# Altium footprint library Standard.PcbLib: 158 footprints (part 6 of 10)
Each footprint in its own frame and in the unit in brackets; x right, y up, seen from the top. Pads: shape width x height; smd on the part's side, far side on the other; paste and mask are expansions set on the pad; w line width, h text height; cw(c..) or ccw(c..) is an arc to the next point about the centre after c.
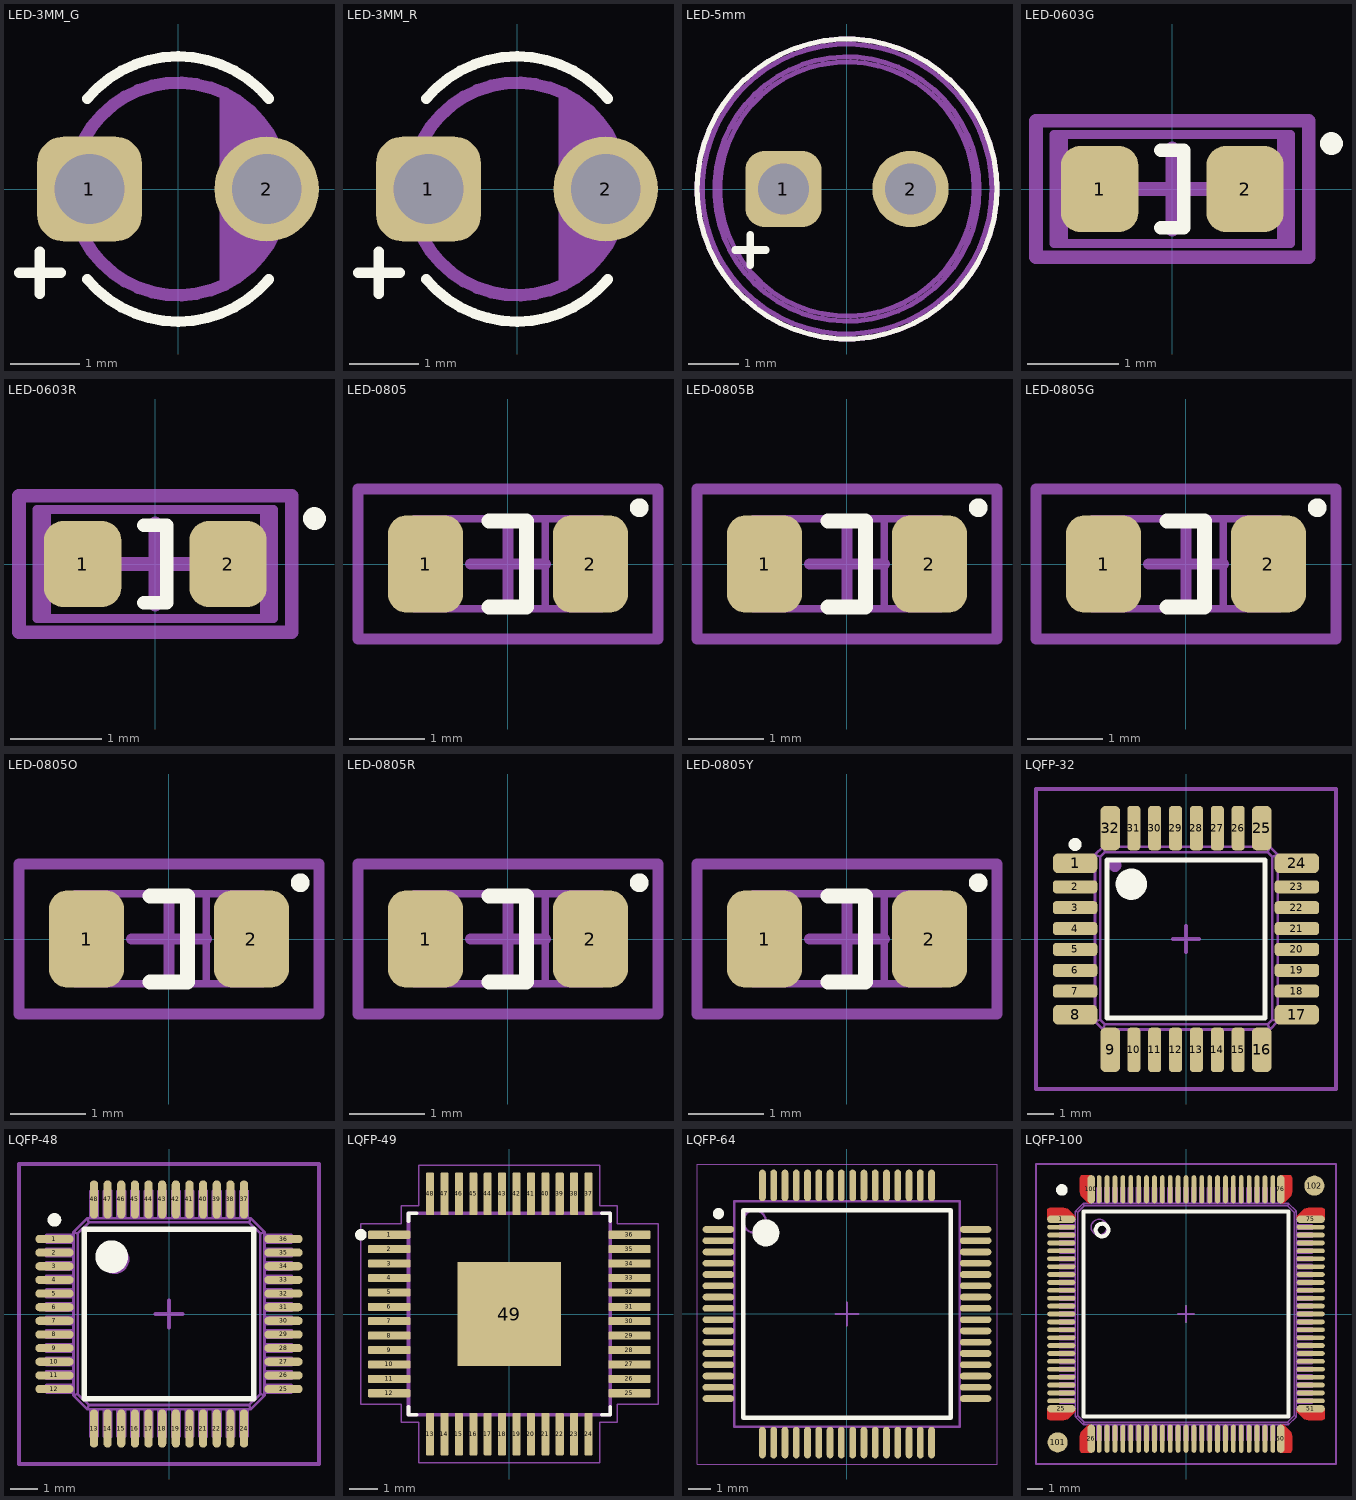
[diagram p5: the footprints below, top view; thin cyan lines are the x and y axes]

## LED-3MM_G [mm]
pads (2):
  rrect50% 1.5x1.5 hole 1: 1(-1.27,0)
  round 1.5 hole 1: 2(1.27,0)
Top Overlay:
  lines w0.15: -2.28,-1.2 -1.68,-1.2 ; -1.98,-1.5 -1.98,-0.9 ; -1.303,-1.293 ccw(c0,-0.2) 1.303,-1.293 ; -1.303,1.293 cw(c0,0.2) 1.303,1.293
Top Assembly:
  circle w0.178: c0,0 r1.524
  region: 0.6,1.4 0.6,-1.4 0.8,-1.3 1,-1.1 1.1,-1 1.4,-0.6 1.5,-0.3 1.5,0.2 1.4,0.5 1.3,0.7 1.2,0.9 1,1.1 0.8,1.3
3D body "User Library-LEDd3G.STEP": height 5.51, standoff -2.49, extent -1.644,-1.654 1.656,1.646

## LED-3MM_R [mm]
pads (2):
  rrect50% 1.5x1.5 hole 1: 1(-1.27,0)
  round 1.5 hole 1: 2(1.27,0)
Top Overlay:
  lines w0.15: -2.28,-1.2 -1.68,-1.2 ; -1.98,-1.5 -1.98,-0.9 ; -1.303,-1.293 ccw(c0,-0.2) 1.303,-1.293 ; -1.303,1.293 cw(c0,0.2) 1.303,1.293
Top Assembly:
  circle w0.178: c0,0 r1.524
  region: 0.6,1.4 0.6,-1.4 0.8,-1.3 1,-1.1 1.1,-1 1.4,-0.6 1.5,-0.3 1.5,0.2 1.4,0.5 1.3,0.7 1.2,0.9 1,1.1 0.8,1.3
3D body "User Library-LEDd3R.STEP": height 5.51, standoff -2.49, extent -1.644,-1.654 1.656,1.646

## LED-5mm [mm]
pads (2):
  rrect50% 1.5x1.5 hole 1: 1(-1.25,0)
  round 1.5 hole 1: 2(1.25,0)
Top Overlay:
  circle w0.1: c0,0 r2.95
  lines w0.15: -2.2,-1.2 -1.6,-1.2 ; -1.9,-1.5 -1.9,-0.9
Top Assembly:
  circle w0.1: c0,0 r2.95
  circle w0.1: c0,0 r2.85
  circle w0.1: c0,0 r2.6
  circle w0.1: c0,0 r2.5
3D body "User Library-LED5MM.SLDPRT": height 12.6, standoff -3, extent -2.95,-2.95 2.95,2.95

## LED-0603G [mm]
height 0.6
pads (2):
  rrect50% 0.85x0.95 smd: 1(-0.8,0) 2(0.8,0)
Top Overlay:
  circle w0.15: c1.75,0.5 r0.05
  lines w0.15: -0.125,-0.425 0.125,-0.425 0.125,0.425 -0.125,0.425
Top Assembly:
  lines w0.1: -1.2,-0.6 -1.2,0.6 ; 1.2,-0.6 1.2,0.6 ; -1.3,-0.6 -1.3,0.6 1.3,0.6 1.3,-0.6 -1.3,-0.6
Top Component Outline:
  lines w0.15: -0.45,0 0.45,0 ; 0,-0.45 0,0.45 ; -1.5,-0.75 -1.5,0.75 1.5,0.75 1.5,-0.75 -1.5,-0.75
3D body "User Library-LED-0603-G.STEP": height 0.65, standoff 0.05, extent -0.8,-0.4 0.8,0.4

## LED-0603R [mm]
height 0.6
pads (2):
  rrect50% 0.85x0.95 smd: 1(-0.8,0) 2(0.8,0)
Top Overlay:
  circle w0.15: c1.75,0.5 r0.05
  lines w0.15: -0.125,-0.425 0.125,-0.425 0.125,0.425 -0.125,0.425
Top Assembly:
  lines w0.1: -1.2,-0.6 -1.2,0.6 ; 1.2,-0.6 1.2,0.6 ; -1.3,-0.6 -1.3,0.6 1.3,0.6 1.3,-0.6 -1.3,-0.6
Top Component Outline:
  lines w0.15: -0.45,0 0.45,0 ; 0,-0.45 0,0.45 ; -1.5,-0.75 -1.5,0.75 1.5,0.75 1.5,-0.75 -1.5,-0.75
3D body "User Library-LED-0603-R.STEP": height 0.65, standoff 0.05, extent -0.8,-0.4 0.8,0.4

## LED-0805 [mm] "Chip Led, 2-Leads, Body 2,00x1,25mm, IPC Medium Density"
height 0.7
pads (2):
  rrect50% 1x1.3 smd: 1(-1.1,0) 2(1.1,0)
Top Overlay:
  circle w0.15: c1.75,0.75 r0.05
  lines w0.2: -0.25,-0.575 0.25,-0.575 0.25,0.575 -0.25,0.575
Top Assembly:
  lines w0.1: 0.5,-0.6 0.5,0.6 ; 0.75,-0.6 0.75,0.6 ; -1.25,-0.6 -1.25,0.6 1.25,0.6 1.25,-0.6 -1.25,-0.6
Top Component Outline:
  lines w0.15: -0.5,0 0.5,0 ; 0,-0.5 0,0.5 ; -2,-1 -2,1 2,1 2,-1 -2,-1
3D body "ALSRobot-LED 0805.STEP": height 1.1, standoff 0, extent -1.01,-0.625 1.01,0.625

## LED-0805B [mm] "Chip Led, 2-Leads, Body 2,00x1,25mm, IPC Medium Density"
height 0.7
pads (2):
  rrect50% 1x1.3 smd: 1(-1.1,0) 2(1.1,0)
Top Overlay:
  circle w0.15: c1.75,0.75 r0.05
  lines w0.2: -0.25,-0.575 0.25,-0.575 0.25,0.575 -0.25,0.575
Top Assembly:
  lines w0.1: 0.5,-0.6 0.5,0.6 ; 0.75,-0.6 0.75,0.6 ; -1.25,-0.6 1.25,-0.6 1.25,0.6 -1.25,0.6 -1.25,-0.6
Top Component Outline:
  lines w0.15: -0.5,0 0.5,0 ; 0,-0.5 0,0.5 ; -2,-1 2,-1 2,1 -2,1 -2,-1
3D body "User Library-led_0805B.STEP": height 1.1, standoff 0, extent -1.01,-0.625 1.01,0.625

## LED-0805G [mm] "Chip Led, 2-Leads, Body 2,00x1,25mm, IPC Medium Density"
height 0.7
pads (2):
  rrect50% 1x1.3 smd: 1(-1.1,0) 2(1.1,0)
Top Overlay:
  circle w0.15: c1.75,0.75 r0.05
  lines w0.2: -0.25,-0.575 0.25,-0.575 0.25,0.575 -0.25,0.575
Top Assembly:
  lines w0.1: 0.5,-0.6 0.5,0.6 ; 0.75,-0.6 0.75,0.6 ; -1.25,-0.6 1.25,-0.6 1.25,0.6 -1.25,0.6 -1.25,-0.6
Top Component Outline:
  lines w0.15: -0.5,0 0.5,0 ; 0,-0.5 0,0.5 ; -2,-1 2,-1 2,1 -2,1 -2,-1
3D body "Led 0805-Green.STEP": height 1.1, standoff 0, extent -1.01,-0.625 1.01,0.625

## LED-0805O [mm] "Chip Led, 2-Leads, Body 2,00x1,25mm, IPC Medium Density"
height 0.7
pads (2):
  rrect50% 1x1.3 smd: 1(-1.1,0) 2(1.1,0)
Top Overlay:
  circle w0.15: c1.75,0.75 r0.05
  lines w0.2: -0.25,-0.575 0.25,-0.575 0.25,0.575 -0.25,0.575
Top Assembly:
  lines w0.1: 0.5,-0.6 0.5,0.6 ; 0.75,-0.6 0.75,0.6 ; -1.25,-0.6 -1.25,0.6 1.25,0.6 1.25,-0.6 -1.25,-0.6
Top Component Outline:
  lines w0.15: -0.5,0 0.5,0 ; 0,-0.5 0,0.5 ; -2,-1 -2,1 2,1 2,-1 -2,-1
3D body "User Library-led_0805O.STEP": height 1.1, standoff 0, extent -1.01,-0.625 1.01,0.625

## LED-0805R [mm] "Chip Led, 2-Leads, Body 2,00x1,25mm, IPC Medium Density"
height 0.7
pads (2):
  rrect50% 1x1.3 smd: 1(-1.1,0) 2(1.1,0)
Top Overlay:
  circle w0.15: c1.75,0.75 r0.05
  lines w0.2: -0.25,-0.575 0.25,-0.575 0.25,0.575 -0.25,0.575
Top Assembly:
  lines w0.1: 0.5,-0.6 0.5,0.6 ; 0.75,-0.6 0.75,0.6 ; -1.25,-0.6 1.25,-0.6 1.25,0.6 -1.25,0.6 -1.25,-0.6
Top Component Outline:
  lines w0.15: -0.5,0 0.5,0 ; 0,-0.5 0,0.5 ; -2,-1 2,-1 2,1 -2,1 -2,-1
3D body "User Library-led_0805R.STEP": height 1.1, standoff 0, extent -1.01,-0.625 1.01,0.625

## LED-0805Y [mm] "Chip Led, 2-Leads, Body 2,00x1,25mm, IPC Medium Density"
height 0.7
pads (2):
  rrect50% 1x1.3 smd: 1(-1.1,0) 2(1.1,0)
Top Overlay:
  circle w0.15: c1.75,0.75 r0.05
  lines w0.2: -0.25,-0.575 0.25,-0.575 0.25,0.575 -0.25,0.575
Top Assembly:
  lines w0.1: 0.5,-0.6 0.5,0.6 ; 0.75,-0.6 0.75,0.6 ; -1.25,-0.6 1.25,-0.6 1.25,0.6 -1.25,0.6 -1.25,-0.6
Top Component Outline:
  lines w0.15: -0.5,0 0.5,0 ; 0,-0.5 0,0.5 ; -2,-1 2,-1 2,1 -2,1 -2,-1
3D body "User Library-led_0805Y.STEP": height 1.1, standoff 0, extent -1.01,-0.625 1.01,0.625

## LQFP-32 [mm] "LQFP, 32-Leads, Body 7,00x7,00mm, Pitch 0,80mm, IPC Medium Density"
height 1.2
pads (32):
  rrect50% 1.7x0.75 smd: 1(-4.25,2.9) 8(-4.25,-2.9) 17(4.25,-2.9) 24(4.25,2.9)
  rrect50% 1.7x0.5 smd: 2(-4.25,2) 3(-4.25,1.2) 4(-4.25,0.4) 5(-4.25,-0.4) 6(-4.25,-1.2) 7(-4.25,-2) 18(4.25,-2) 19(4.25,-1.2) 20(4.25,-0.4) 21(4.25,0.4) 22(4.25,1.2) 23(4.25,2)
  rrect50% 0.75x1.7 smd: 9(-2.9,-4.25) 16(2.9,-4.25) 25(2.9,4.25) 32(-2.9,4.25)
  rrect50% 0.5x1.7 smd: 10(-2,-4.25) 11(-1.2,-4.25) 12(-0.4,-4.25) 13(0.4,-4.25) 14(1.2,-4.25) 15(2,-4.25) 26(2,4.25) 27(1.2,4.25) 28(0.4,4.25) 29(-0.4,4.25) 30(-1.2,4.25) 31(-2,4.25)
Top Overlay:
  circle w0.6: c-2.1,2.1 r0.3
  circle w0.25: c-4.25,3.625 r0.125
  lines w0.2: -3.025,-3.025 -3.025,3.025 3.025,3.025 3.025,-3.025 -3.025,-3.025
Top Assembly:
  drawing of 313 lines, arcs and shapes, not listed
Top Component Outline:
  lines w0.15: -0.5,0 0.5,0 ; 0,-0.5 0,0.5 ; -5.75,-5.75 -5.75,5.75 5.75,5.75 5.75,-5.75 -5.75,-5.75
3D body "User Library-lqfp32-1.step": height 1.5, standoff 0.02, extent -4.5,-4.5 4.5,4.5

## LQFP-48 [mm] "SQFP, 48-Leads, Body 7,00x7,00mm, Pitch 0,50mm, IPC Medium Density"
height 1.8
pads (48):
  oval 1.4x0.3 smd: 1(-4.2,2.75) 2(-4.2,2.25) 3(-4.2,1.75) 4(-4.2,1.25) 5(-4.2,0.75) 6(-4.2,0.25) 7(-4.2,-0.25) 8(-4.2,-0.75) 9(-4.2,-1.25) 10(-4.2,-1.75) 11(-4.2,-2.25) 12(-4.2,-2.75) 25(4.2,-2.75) 26(4.2,-2.25) 27(4.2,-1.75) 28(4.2,-1.25) 29(4.2,-0.75) 30(4.2,-0.25) 31(4.2,0.25) 32(4.2,0.75) 33(4.2,1.25) 34(4.2,1.75) 35(4.2,2.25) 36(4.2,2.75)
  oval 0.3x1.4 smd: 13(-2.75,-4.2) 14(-2.25,-4.2) 15(-1.75,-4.2) 16(-1.25,-4.2) 17(-0.75,-4.2) 18(-0.25,-4.2) 19(0.25,-4.2) 20(0.75,-4.2) 21(1.25,-4.2) 22(1.75,-4.2) 23(2.25,-4.2) 24(2.75,-4.2) 37(2.75,4.2) 38(2.25,4.2) 39(1.75,4.2) 40(1.25,4.2) 41(0.75,4.2) 42(0.25,4.2) 43(-0.25,4.2) 44(-0.75,4.2) 45(-1.25,4.2) 46(-1.75,4.2) 47(-2.25,4.2) 48(-2.75,4.2)
Top Overlay:
  circle w0.6: c-2.1,2.1 r0.3
  circle w0.25: c-4.2,3.45 r0.125
  lines w0.2: -3.1,-3.1 3.1,-3.1 3.1,3.1 -3.1,3.1 -3.1,-3.1
Top Assembly:
  drawing of 1945 lines, arcs and shapes, not listed
Top Component Outline:
  lines w0.15: -0.5,0 0.5,0 ; 0,-0.5 0,0.5 ; -5.5,-5.5 -5.5,5.5 5.5,5.5 5.5,-5.5 -5.5,-5.5
3D body "User Library-LQFP48_Grid_0_5.STEP": height 1.6, standoff 0, extent -4.5,-4.5 4.5,4.5

## LQFP-49 [mm]
pads (49):
  rrect25% 1.47x0.28 smd: 1(-4.17,2.75) 2(-4.17,2.25) 3(-4.17,1.75) 4(-4.17,1.25) 5(-4.17,0.75) 6(-4.17,0.25) 7(-4.17,-0.25) 8(-4.17,-0.75) 9(-4.17,-1.25) 10(-4.17,-1.75) 11(-4.17,-2.25) 12(-4.17,-2.75) 25(4.17,-2.75) 26(4.17,-2.25) 27(4.17,-1.75) 28(4.17,-1.25) 29(4.17,-0.75) 30(4.17,-0.25) 31(4.17,0.25) 32(4.17,0.75) 33(4.17,1.25) 34(4.17,1.75) 35(4.17,2.25) 36(4.17,2.75)
  rrect25% 0.28x1.47 smd: 13(-2.75,-4.17) 14(-2.25,-4.17) 15(-1.75,-4.17) 16(-1.25,-4.17) 17(-0.75,-4.17) 18(-0.25,-4.17) 19(0.25,-4.17) 20(0.75,-4.17) 21(1.25,-4.17) 22(1.75,-4.17) 23(2.25,-4.17) 24(2.75,-4.17) 37(2.75,4.17) 38(2.25,4.17) 39(1.75,4.17) 40(1.25,4.17) 41(0.75,4.17) 42(0.25,4.17) 43(-0.25,4.17) 44(-0.75,4.17) 45(-1.25,4.17) 46(-1.75,4.17) 47(-2.25,4.17) 48(-2.75,4.17)
  rect 3.6x3.6 smd paste-3: 49(0,0)
Top Overlay:
  circle w0.2: c-5.152,2.75 r0.1
  lines w0.127: -3.5,-3.215 -3.5,-3.5 -3.215,-3.5 ; -3.5,3.215 -3.5,3.5 -3.215,3.5 ; 3.215,-3.5 3.5,-3.5 3.5,-3.215 ; 3.215,3.5 3.5,3.5 3.5,3.215
Top Paste:
  region: 1.445,-1.446 0.175,-1.446 0.175,-0.175 1.445,-0.175
  region: 1.445,0.175 0.175,0.175 0.175,1.445 1.445,1.445
  region: -0.175,0.175 -1.447,0.175 -1.447,1.445 -0.175,1.445
  region: -0.175,-1.447 -1.447,-1.447 -1.447,-0.175 -0.175,-0.175
Top Assembly:
  lines w0.127: -3.5,-3.5 3.5,-3.5 3.5,3.5 -3.5,3.5 -3.5,-3.5
Top Component Outline:
  lines w0.05: -5.16,-3.14 -5.16,3.14 -3.75,3.14 -3.75,3.75 -3.14,3.75 -3.14,5.16 3.14,5.16 3.14,3.75 3.75,3.75 3.75,3.14 5.16,3.14 5.16,-3.14 3.75,-3.14 3.75,-3.75 3.14,-3.75 3.14,-5.16 -3.14,-5.16 -3.14,-3.75 -3.75,-3.75 -3.75,-3.14 -5.16,-3.14
3D body "User Library-LQFP48_Grid_0_5.STEP": height 1.6, standoff 0, extent -4.5,-4.5 4.5,4.5

## LQFP-64 [mm] "SQFP, 64-Leads, Body 10,00x10,00mm, Pitch 0,50mm, IPC Medium Density"
height 2.45
pads (64):
  oval 1.4x0.3 smd: 1(-5.7,3.75) 2(-5.7,3.25) 3(-5.7,2.75) 4(-5.7,2.25) 5(-5.7,1.75) 6(-5.7,1.25) 7(-5.7,0.75) 8(-5.7,0.25) 9(-5.7,-0.25) 10(-5.7,-0.75) 11(-5.7,-1.25) 12(-5.7,-1.75) 13(-5.7,-2.25) 14(-5.7,-2.75) 15(-5.7,-3.25) 16(-5.7,-3.75) 33(5.7,-3.75) 34(5.7,-3.25) 35(5.7,-2.75) 36(5.7,-2.25) 37(5.7,-1.75) 38(5.7,-1.25) 39(5.7,-0.75) 40(5.7,-0.25) 41(5.7,0.25) 42(5.7,0.75) 43(5.7,1.25) 44(5.7,1.75) 45(5.7,2.25) 46(5.7,2.75) 47(5.7,3.25) 48(5.7,3.75)
  oval 0.3x1.4 smd: 17(-3.75,-5.7) 18(-3.25,-5.7) 19(-2.75,-5.7) 20(-2.25,-5.7) 21(-1.75,-5.7) 22(-1.25,-5.7) 23(-0.75,-5.7) 24(-0.25,-5.7) 25(0.25,-5.7) 26(0.75,-5.7) 27(1.25,-5.7) 28(1.75,-5.7) 29(2.25,-5.7) 30(2.75,-5.7) 31(3.25,-5.7) 32(3.75,-5.7) 49(3.75,5.7) 50(3.25,5.7) 51(2.75,5.7) 52(2.25,5.7) 53(1.75,5.7) 54(1.25,5.7) 55(0.75,5.7) 56(0.25,5.7) 57(-0.25,5.7) 58(-0.75,5.7) 59(-1.25,5.7) 60(-1.75,5.7) 61(-2.25,5.7) 62(-2.75,5.7) 63(-3.25,5.7) 64(-3.75,5.7)
Top Overlay:
  circle w0.6: c-3.6,3.6 r0.3
  circle w0.25: c-5.7,4.45 r0.125
  lines w0.2: -4.6,-4.6 4.6,-4.6 4.6,4.6 -4.6,4.6 -4.6,-4.6
Top Assembly:
  circle w0.1: c-4.1,4.1 r0.5
  lines w0.1: -5,-5 5,-5 5,5 -5,5 -5,-5
Top Component Outline:
  lines w0.05: -6.65,-6.65 6.65,-6.65 6.65,6.65 -6.65,6.65 -6.65,-6.65
  lines w0.1: -0.5,0 0.5,0 ; 0,-0.5 0,0.5
3D body "SQFP50P1200X1200X245-64N.step": height 2.45, standoff 0, extent -6,-6 6,6

## LQFP-100 [mm]
pads (110):
  oval 1.78x0.5 smd: 1(-7.9,6) 25(-7.9,-6) 51(7.9,-6) 75(7.9,6)
  round 0 smd paste-25.4 mask-25.4: 1(-7.9,6) 25(-7.9,-6) 26(-6,-7.9) 50(6,-7.9) 51(7.9,-6) 75(7.9,6) 76(6,7.9) 100(-6,7.9)
  oval 1.78x0.3 smd: 2(-7.9,5.5) 3(-7.9,5) 4(-7.9,4.5) 5(-7.9,4) 6(-7.9,3.5) 7(-7.9,3) 8(-7.9,2.5) 9(-7.9,2) 10(-7.9,1.5) 11(-7.9,1) 12(-7.9,0.5) 13(-7.9,0) 14(-7.9,-0.5) 15(-7.9,-1) 16(-7.9,-1.5) 17(-7.9,-2) 18(-7.9,-2.5) 19(-7.9,-3) 20(-7.9,-3.5) 21(-7.9,-4) 22(-7.9,-4.5) 23(-7.9,-5) 24(-7.9,-5.5) 52(7.9,-5.5) 53(7.9,-5) 54(7.9,-4.5) 55(7.9,-4) 56(7.9,-3.5) 57(7.9,-3) 58(7.9,-2.5) 59(7.9,-2) 60(7.9,-1.5) 61(7.9,-1) 62(7.9,-0.5) 63(7.9,0) 64(7.9,0.5) 65(7.9,1) 66(7.9,1.5) 67(7.9,2) 68(7.9,2.5) 69(7.9,3) 70(7.9,3.5) 71(7.9,4) 72(7.9,4.5) 73(7.9,5) 74(7.9,5.5)
  oval 0.5x1.78 smd: 26(-6,-7.9) 50(6,-7.9) 76(6,7.9) 100(-6,7.9)
  oval 0.3x1.78 smd: 27(-5.5,-7.9) 28(-5,-7.9) 29(-4.5,-7.9) 30(-4,-7.9) 31(-3.5,-7.9) 32(-3,-7.9) 33(-2.5,-7.9) 34(-2,-7.9) 35(-1.5,-7.9) 36(-1,-7.9) 37(-0.5,-7.9) 38(0,-7.9) 39(0.5,-7.9) 40(1,-7.9) 41(1.5,-7.9) 42(2,-7.9) 43(2.5,-7.9) 44(3,-7.9) 45(3.5,-7.9) 46(4,-7.9) 47(4.5,-7.9) 48(5,-7.9) 49(5.5,-7.9) 77(5.5,7.9) 78(5,7.9) 79(4.5,7.9) 80(4,7.9) 81(3.5,7.9) 82(3,7.9) 83(2.5,7.9) 84(2,7.9) 85(1.5,7.9) 86(1,7.9) 87(0.5,7.9) 88(0,7.9) 89(-0.5,7.9) 90(-1,7.9) 91(-1.5,7.9) 92(-2,7.9) 93(-2.5,7.9) 94(-3,7.9) 95(-3.5,7.9) 96(-4,7.9) 97(-4.5,7.9) 98(-5,7.9) 99(-5.5,7.9)
  round 1.27 smd mask-25.4: 101(-8.128,-8.128) 102(8.128,8.128)
Top Layer:
  region: -7.01,-6.137 -7.021,-6.191 -7.051,-6.236 -7.389,-6.574 -7.492,-6.653 -7.613,-6.703 -7.742,-6.72 -8.642,-6.72 -8.699,-6.709 -8.747,-6.677 -8.779,-6.629 -8.79,-6.573 -8.79,-6.008 -7.01,-6
  region: -7.01,6.137 -7.021,6.191 -7.051,6.236 -7.389,6.574 -7.492,6.653 -7.613,6.703 -7.742,6.72 -8.642,6.72 -8.699,6.709 -8.747,6.677 -8.779,6.629 -8.79,6.573 -8.79,6.008 -7.01,6
  region: -6.137,7.01 -6.191,7.021 -6.236,7.051 -6.574,7.389 -6.653,7.492 -6.703,7.613 -6.72,7.742 -6.72,8.642 -6.709,8.699 -6.677,8.747 -6.629,8.779 -6.573,8.79 -6.008,8.79 -6,7.01
  region: 6.137,7.01 6.191,7.021 6.236,7.051 6.574,7.389 6.653,7.492 6.703,7.613 6.72,7.742 6.72,8.642 6.709,8.699 6.677,8.747 6.629,8.779 6.573,8.79 6.008,8.79 6,7.01
  region: 7.01,6.137 7.021,6.191 7.051,6.236 7.389,6.574 7.492,6.653 7.613,6.703 7.742,6.72 8.643,6.72 8.699,6.709 8.747,6.677 8.779,6.629 8.79,6.573 8.79,6.008 7.01,6
  region: 7.01,-6.137 7.021,-6.191 7.051,-6.236 7.389,-6.574 7.492,-6.653 7.613,-6.703 7.742,-6.72 8.643,-6.72 8.699,-6.709 8.747,-6.677 8.779,-6.629 8.79,-6.573 8.79,-6.008 7.01,-6
  region: 6.137,-7.01 6.191,-7.021 6.236,-7.051 6.574,-7.389 6.653,-7.492 6.703,-7.613 6.72,-7.742 6.72,-8.642 6.709,-8.699 6.677,-8.747 6.629,-8.779 6.573,-8.79 6.008,-8.79 6,-7.01
  region: -6.137,-7.01 -6.191,-7.021 -6.236,-7.051 -6.574,-7.389 -6.653,-7.492 -6.703,-7.613 -6.72,-7.742 -6.72,-8.642 -6.709,-8.699 -6.677,-8.747 -6.629,-8.779 -6.573,-8.79 -6.008,-8.79 -6,-7.01
Top Overlay:
  circle w0.254: c-5.318,5.318 r0.4
  circle w0.4: c-7.858,7.858 r0.168
  lines w0.254: -6.477,-6.477 -6.477,6.477 6.477,6.477 6.477,-6.477 -6.477,-6.477
Top Solder:
  region: -8.128,-6.847 -8.46,-6.891 -8.768,-7.019 -9.034,-7.222 -9.237,-7.488 -9.365,-7.796 -9.409,-8.128 -9.365,-8.46 -9.237,-8.768 -9.034,-9.034 -8.768,-9.237 -8.46,-9.365 -8.128,-9.409 -7.796,-9.365 -7.488,-9.237 -7.222,-9.034 -7.019,-8.768 -6.891,-8.46 -6.847,-8.128 -6.891,-7.796 -7.019,-7.488 -7.222,-7.222 -7.488,-7.019 -7.796,-6.891
  region: 8.128,9.409 7.796,9.365 7.488,9.237 7.222,9.034 7.019,8.768 6.891,8.46 6.847,8.128 6.891,7.796 7.019,7.488 7.222,7.222 7.488,7.019 7.796,6.891 8.128,6.847 8.46,6.891 8.768,7.019 9.034,7.222 9.237,7.488 9.365,7.796 9.409,8.128 9.365,8.46 9.237,8.768 9.034,9.034 8.768,9.237 8.46,9.365
Top Assembly:
  drawing of 4025 lines, arcs and shapes, not listed
Top Component Outline:
  lines w0.15: -0.5,0 0.5,0 ; 0,-0.5 0,0.5 ; -9.5,-9.5 9.5,-9.5 9.5,9.5 -9.5,9.5 -9.5,-9.5
3D body "User Library-LQFP100_Grid_0_5.STEP": height 1.6, standoff 0, extent -8,-8 8,8